# Altium footprint library Inductors THD.PcbLib: 43 footprints (part 2 of 4) (continued)
## IND_EDA-03282-V1-0_misc1 [mm] "see EDA-03282-V1-0 _misc1"
height 12.9
pads (10):
  round 2 hole 1.3: 1(-10,11.25) 1(-5,11.25) 1(0,11.25) 1(5,11.25) 1(10,11.25) 2(-10,-11.25) 2(-5,-11.25) 2(0,-11.25) 2(5,-11.25) 2(10,-11.25)
Top Overlay:
  lines w0.2: -12.3,12.6 cw(c-11.5,12) -11.5,13 -11.482,13 -10.313,12.61 ccw(c-10.25,12.8) -10.169,12.617 -9.269,13.017 ccw(c-9.309,13.109) -9.35,13.2 -10.179,12.832 cw(c-10.26,13.014) -10.324,12.825 -12.421,13.524 ccw(c-12.485,13.334) -12.683,13.361 -13.588,6.758 ccw(c-13.389,6.731) -13.589,6.731 -13.589,-6.531 ccw(c-13.389,-6.531) -13.588,-6.558 -12.683,-13.161 ccw(c-12.485,-13.134) -12.421,-13.324 -10.303,-12.618 cw(c-10.239,-12.807) -10.196,-12.612 -9.35,-12.8 -10.85,-12.8 ; -11.1,-12.4 -12.5,-12.4 -12.5,12.6 12.5,12.6 12.5,-12.4 11.1,-12.4 ; -10.85,13 -9.8,13 ; -9.55,-9.95 -9.55,9.95 ; -9.55,-9.2 9.55,-9.2 ; -9.55,9.4 9.55,9.4 ; -9.308,13 9.308,13 ; -9.307,-12.8 9.307,-12.8 ; -6.55,-8.1 -6.55,8.3 ; 6.55,-8.1 6.55,8.3 ; 9.55,-9.95 9.55,9.95 ; 9.8,13 10.85,13 ; 10.85,-12.8 9.35,-12.8 10.196,-12.612 cw(c10.239,-12.807) 10.303,-12.618 12.421,-13.324 ccw(c12.485,-13.134) 12.683,-13.161 13.588,-6.558 ccw(c13.39,-6.531) 13.59,-6.531 13.59,6.731 ccw(c13.39,6.731) 13.588,6.758 12.683,13.361 ccw(c12.485,13.334) 12.421,13.524 10.324,12.825 cw(c10.26,13.014) 10.179,12.832 9.35,13.2 ccw(c9.309,13.109) 9.269,13.017 10.169,12.617 ccw(c10.25,12.8) 10.313,12.61 11.498,13.005 ; 11.483,13 11.5,13 cw(c11.5,12) 12.3,12.6 ; -9,-8.9 -9,-8.1 9,-8.1 9,-8.9 -9,-8.9 ; -9,8.3 -9,9.1 9,9.1 9,8.3 -9,8.3
  text "10" at -11.6,-9.6 h1
  text "6" at 10.4,-9.6 h1
  text "5" at 10.4,8.6 h1
  text "1" at -10.8,8.6 h1
Mechanical 8:
  lines w0.1: -10.5,-11.25 -10,-11.25 ; -10.5,11.25 -10,11.25 ; -10,-11.75 -10,-11.25 ; -10,-10.75 -10,-11.25 ; -10,10.75 -10,11.25 ; -10,11.75 -10,11.25 ; -9.5,-11.25 -10,-11.25 ; -9.5,11.25 -10,11.25 ; -5.5,-11.25 -5,-11.25 ; -5.5,11.25 -5,11.25 ; -5,-11.75 -5,-11.25 ; -5,-10.75 -5,-11.25 ; -5,10.75 -5,11.25 ; -5,11.75 -5,11.25 ; -4.5,-11.25 -5,-11.25 ; -4.5,11.25 -5,11.25 ; -0.5,-11.25 0,-11.25 ; -0.5,0 0,0 ; -0.5,11.25 0,11.25 ; 0,-11.75 0,-11.25 ; 0,-10.75 0,-11.25 ; 0,-0.5 0,0 ; 0,0.5 0,0 ; 0,10.75 0,11.25 ; 0,11.75 0,11.25 ; 0.5,-11.25 0,-11.25 ; 0.5,0 0,0 ; 0.5,11.25 0,11.25 ; 4.5,-11.25 5,-11.25 ; 4.5,11.25 5,11.25 ; 5,-11.75 5,-11.25 ; 5,-10.75 5,-11.25 ; 5,10.75 5,11.25 ; 5,11.75 5,11.25 ; 5.5,-11.25 5,-11.25 ; 5.5,11.25 5,11.25 ; 9.5,-11.25 10,-11.25 ; 9.5,11.25 10,11.25 ; 10,-11.75 10,-11.25 ; 10,-10.75 10,-11.25 ; 10,10.75 10,11.25 ; 10,11.75 10,11.25 ; 10.5,-11.25 10,-11.25 ; 10.5,11.25 10,11.25 ; -11,-12.25 -11,-10.25 11,-10.25 11,-12.25 -11,-12.25 ; -11,10.25 -11,12.25 11,12.25 11,10.25 -11,10.25
Mechanical 14:
  lines w0.1: -12.3,-12.4 ccw(c-11.5,-11.8) -11.5,-12.8 -11.482,-12.8 ; -12.3,12.6 cw(c-11.5,12) -11.5,13 -11.482,13 ; -10.85,-12.8 -9.35,-12.8 ; -10.85,13 -9.8,13 ; -9.55,-9.2 9.55,-9.2 ; -9.55,9.4 9.55,9.4 ; -9.308,13 9.308,13 ; -9.307,-12.8 9.307,-12.8 ; -6.55,-8.1 -6.55,8.3 ; 6.55,-8.1 6.55,8.3 ; 9.8,13 10.85,13 ; 10.85,-12.8 9.35,-12.8 ; 11.483,-12.8 11.5,-12.8 ccw(c11.5,-11.8) 12.3,-12.4 ; 11.483,13 11.5,13 cw(c11.5,12) 12.3,12.6 ; -9.35,-12.8 ccw(c-9.328,-12.702) -9.307,-12.605 -10.207,-12.405 ccw(c-10.25,-12.6) -10.313,-12.41 -12.256,-13.058 cw(c-12.319,-12.868) -12.517,-12.895 -13.386,-6.558 cw(c-13.188,-6.53) -13.388,-6.531 -13.406,6.597 cw(c-13.206,6.598) -13.404,6.625 -12.517,13.095 cw(c-12.319,13.068) -12.256,13.258 -10.313,12.61 ccw(c-10.25,12.8) -10.169,12.617 -9.269,13.017 ccw(c-9.309,13.109) -9.35,13.2 -10.179,12.832 cw(c-10.26,13.014) -10.324,12.825 -12.421,13.524 ccw(c-12.485,13.334) -12.683,13.361 -13.588,6.758 ccw(c-13.389,6.731) -13.589,6.731 -13.589,-6.531 ccw(c-13.389,-6.531) -13.588,-6.558 -12.683,-13.161 ccw(c-12.485,-13.134) -12.421,-13.324 -10.303,-12.618 cw(c-10.239,-12.807) -10.196,-12.612 -9.35,-12.8 ; 9.35,-12.8 cw(c9.328,-12.702) 9.307,-12.605 10.207,-12.405 cw(c10.25,-12.6) 10.313,-12.41 12.256,-13.058 ccw(c12.319,-12.868) 12.517,-12.895 13.386,-6.558 ccw(c13.188,-6.53) 13.388,-6.531 13.406,6.598 ccw(c13.206,6.598) 13.404,6.625 12.517,13.095 ccw(c12.319,13.068) 12.256,13.258 10.313,12.61 cw(c10.25,12.8) 10.169,12.617 9.269,13.017 cw(c9.309,13.109) 9.35,13.2 10.179,12.832 ccw(c10.26,13.014) 10.324,12.825 12.421,13.524 cw(c12.485,13.334) 12.683,13.361 13.588,6.758 cw(c13.39,6.731) 13.59,6.731 13.59,-6.531 cw(c13.39,-6.531) 13.588,-6.558 12.683,-13.161 cw(c12.485,-13.134) 12.421,-13.324 10.303,-12.618 ccw(c10.239,-12.807) 10.196,-12.612 9.35,-12.8 ; -12.5,-12.4 -12.5,12.6 12.5,12.6 12.5,-12.4 -12.5,-12.4 ; -9.55,-12.2 -9.55,12.4 9.55,12.4 9.55,-12.2 -9.55,-12.2 ; -9,-8.9 -9,-8.1 9,-8.1 9,-8.9 -9,-8.9 ; -9,8.3 -9,9.1 9,9.1 9,8.3 -9,8.3
Multi-Layer:
  lines w2: -10,-11.25 10,-11.25 ; -10,11.25 10,11.25
3D body "IND_EDA-03282-V1-0_misc1.stp": height 12.9, standoff -3.5, extent -13.589,-13.333 13.59,13.534

## IND_EDA-03282-V1-0_misc2 [mm] "see EDA-03282-V1-0 _misc2"
height 12.9
pads (10):
  round 2 hole 1.3: 1(-10,11.25) 1(-5,11.25) 1(0,11.25) 1(5,11.25) 1(10,11.25) 2(-10,-11.25) 2(-5,-11.25) 2(0,-11.25) 2(5,-11.25) 2(10,-11.25)
Top Overlay:
  lines w0.2: -12.3,12.6 cw(c-11.5,12) -11.5,13 -11.482,13 -10.313,12.61 ccw(c-10.25,12.8) -10.169,12.617 -9.269,13.017 ccw(c-9.309,13.109) -9.35,13.2 -10.179,12.832 cw(c-10.26,13.014) -10.324,12.825 -12.421,13.524 ccw(c-12.485,13.334) -12.683,13.361 -13.588,6.758 ccw(c-13.389,6.731) -13.589,6.731 -13.589,-6.531 ccw(c-13.389,-6.531) -13.588,-6.558 -12.683,-13.161 ccw(c-12.485,-13.134) -12.421,-13.324 -10.303,-12.618 cw(c-10.239,-12.807) -10.196,-12.612 -9.35,-12.8 -10.85,-12.8 ; -11.1,-12.4 -12.5,-12.4 -12.5,12.6 12.5,12.6 12.5,-12.4 11.1,-12.4 ; -10.85,13 -9.8,13 ; -9.55,-9.95 -9.55,9.95 ; -9.55,-9.2 9.55,-9.2 ; -9.55,9.4 9.55,9.4 ; -9.308,13 9.308,13 ; -9.307,-12.8 9.307,-12.8 ; -6.55,-8.1 -6.55,8.3 ; 6.55,-8.1 6.55,8.3 ; 9.55,-9.95 9.55,9.95 ; 9.8,13 10.85,13 ; 10.85,-12.8 9.35,-12.8 10.196,-12.612 cw(c10.239,-12.807) 10.303,-12.618 12.421,-13.324 ccw(c12.485,-13.134) 12.683,-13.161 13.588,-6.558 ccw(c13.39,-6.531) 13.59,-6.531 13.59,6.731 ccw(c13.39,6.731) 13.588,6.758 12.683,13.361 ccw(c12.485,13.334) 12.421,13.524 10.324,12.825 cw(c10.26,13.014) 10.179,12.832 9.35,13.2 ccw(c9.309,13.109) 9.269,13.017 10.169,12.617 ccw(c10.25,12.8) 10.313,12.61 11.498,13.005 ; 11.483,13 11.5,13 cw(c11.5,12) 12.3,12.6 ; -9,-8.9 9,-8.9 9,-8.1 -9,-8.1 -9,-8.9 ; -9,8.3 9,8.3 9,9.1 -9,9.1 -9,8.3
  text "1" at -10.8,8.6 h1
  text "5" at 10.4,8.6 h1
  text "6" at 10.4,-9.6 h1
  text "10" at -11.6,-9.6 h1
Mechanical 8:
  lines w0.1: -10.5,-11.25 -10,-11.25 ; -10.5,11.25 -10,11.25 ; -10,-11.75 -10,-11.25 ; -10,-10.75 -10,-11.25 ; -10,10.75 -10,11.25 ; -10,11.75 -10,11.25 ; -9.5,-11.25 -10,-11.25 ; -9.5,11.25 -10,11.25 ; -5.5,-11.25 -5,-11.25 ; -5.5,11.25 -5,11.25 ; -5,-11.75 -5,-11.25 ; -5,-10.75 -5,-11.25 ; -5,10.75 -5,11.25 ; -5,11.75 -5,11.25 ; -4.5,-11.25 -5,-11.25 ; -4.5,11.25 -5,11.25 ; -0.5,-11.25 0,-11.25 ; -0.5,0 0,0 ; -0.5,11.25 0,11.25 ; 0,-11.75 0,-11.25 ; 0,-10.75 0,-11.25 ; 0,-0.5 0,0 ; 0,0.5 0,0 ; 0,10.75 0,11.25 ; 0,11.75 0,11.25 ; 0.5,-11.25 0,-11.25 ; 0.5,0 0,0 ; 0.5,11.25 0,11.25 ; 4.5,-11.25 5,-11.25 ; 4.5,11.25 5,11.25 ; 5,-11.75 5,-11.25 ; 5,-10.75 5,-11.25 ; 5,10.75 5,11.25 ; 5,11.75 5,11.25 ; 5.5,-11.25 5,-11.25 ; 5.5,11.25 5,11.25 ; 9.5,-11.25 10,-11.25 ; 9.5,11.25 10,11.25 ; 10,-11.75 10,-11.25 ; 10,-10.75 10,-11.25 ; 10,10.75 10,11.25 ; 10,11.75 10,11.25 ; 10.5,-11.25 10,-11.25 ; 10.5,11.25 10,11.25 ; -11,-12.25 11,-12.25 11,-10.25 -11,-10.25 -11,-12.25 ; -11,10.25 11,10.25 11,12.25 -11,12.25 -11,10.25
Mechanical 14:
  lines w0.1: -12.3,-12.4 ccw(c-11.5,-11.8) -11.5,-12.8 -11.482,-12.8 ; -12.3,12.6 cw(c-11.5,12) -11.5,13 -11.482,13 ; -10.85,-12.8 -9.35,-12.8 ; -10.85,13 -9.8,13 ; -9.55,-9.2 9.55,-9.2 ; -9.55,9.4 9.55,9.4 ; -9.308,13 9.308,13 ; -9.307,-12.8 9.307,-12.8 ; -6.55,-8.1 -6.55,8.3 ; 6.55,-8.1 6.55,8.3 ; 9.8,13 10.85,13 ; 10.85,-12.8 9.35,-12.8 ; 11.483,-12.8 11.5,-12.8 ccw(c11.5,-11.8) 12.3,-12.4 ; 11.483,13 11.5,13 cw(c11.5,12) 12.3,12.6 ; -9.35,-12.8 ccw(c-9.328,-12.702) -9.307,-12.605 -10.207,-12.405 ccw(c-10.25,-12.6) -10.313,-12.41 -12.256,-13.058 cw(c-12.319,-12.868) -12.517,-12.895 -13.386,-6.558 cw(c-13.188,-6.53) -13.388,-6.531 -13.406,6.597 cw(c-13.206,6.598) -13.404,6.625 -12.517,13.095 cw(c-12.319,13.068) -12.256,13.258 -10.313,12.61 ccw(c-10.25,12.8) -10.169,12.617 -9.269,13.017 ccw(c-9.309,13.109) -9.35,13.2 -10.179,12.832 cw(c-10.26,13.014) -10.324,12.825 -12.421,13.524 ccw(c-12.485,13.334) -12.683,13.361 -13.588,6.758 ccw(c-13.389,6.731) -13.589,6.731 -13.589,-6.531 ccw(c-13.389,-6.531) -13.588,-6.558 -12.683,-13.161 ccw(c-12.485,-13.134) -12.421,-13.324 -10.303,-12.618 cw(c-10.239,-12.807) -10.196,-12.612 -9.35,-12.8 ; 9.35,-12.8 cw(c9.328,-12.702) 9.307,-12.605 10.207,-12.405 cw(c10.25,-12.6) 10.313,-12.41 12.256,-13.058 ccw(c12.319,-12.868) 12.517,-12.895 13.386,-6.558 ccw(c13.188,-6.53) 13.388,-6.531 13.406,6.598 ccw(c13.206,6.598) 13.404,6.625 12.517,13.095 ccw(c12.319,13.068) 12.256,13.258 10.313,12.61 cw(c10.25,12.8) 10.169,12.617 9.269,13.017 cw(c9.309,13.109) 9.35,13.2 10.179,12.832 ccw(c10.26,13.014) 10.324,12.825 12.421,13.524 cw(c12.485,13.334) 12.683,13.361 13.588,6.758 cw(c13.39,6.731) 13.59,6.731 13.59,-6.531 cw(c13.39,-6.531) 13.588,-6.558 12.683,-13.161 cw(c12.485,-13.134) 12.421,-13.324 10.303,-12.618 ccw(c10.239,-12.807) 10.196,-12.612 9.35,-12.8 ; -12.5,-12.4 12.5,-12.4 12.5,12.6 -12.5,12.6 -12.5,-12.4 ; -9.55,-12.2 9.55,-12.2 9.55,12.4 -9.55,12.4 -9.55,-12.2 ; -9,-8.9 9,-8.9 9,-8.1 -9,-8.1 -9,-8.9 ; -9,8.3 9,8.3 9,9.1 -9,9.1 -9,8.3
Multi-Layer:
  lines w2: -10,-11.25 10,-11.25 ; -10,11.25 10,11.25
3D body "IND_EDA-03282-V1-0_misc2.stp": height 12.9, standoff -3.5, extent -13.589,-13.333 13.59,13.534

## IND_FERROXCUBE_WBC2.5/A-3S4 [mm] "Wideband Choke, Axial, Pad spacing 15.24 mm - Body Lengh 10mm X Body Diameter 6mm"
height 6
pads (2):
  round 1.6 hole 0.9: 1(-7.62,-1.27) 2(7.62,1.27)
Top Overlay:
  lines w0.2: -6.35,-1.27 -5.08,-1.27 ; -5.08,0 cw(c-5.08,1) -5.08,2 ; 5.08,-2 ccw(c5.08,-1) 5.08,0 ; 5.08,1.27 6.35,1.27 ; -5.08,-3 -5.08,3 5.08,3 5.08,-3 -5.08,-3
Mechanical 14:
  lines w0.1: -6.35,-1.27 -5.08,-1.27 ; -5.08,0 cw(c-5.08,1) -5.08,2 ; 5.08,-2 ccw(c5.08,-1) 5.08,0 ; 5.08,1.27 6.35,1.27 ; -5.08,-3 -5.08,3 5.08,3 5.08,-3 -5.08,-3
3D body "IND_FERROXCUBE_WBC2.5-SP-3S4.stp": height 6, standoff -3.6, extent -7.92,-2.947 7.92,3.052

## IND_FERROXCUBE_WBC2.5/A-4B1 [mm] "Wideband Choke, Axial, Pad spacing 15.24 mm - Body Lengh 10mm X Body Diameter 6mm"
height 6
pads (2):
  round 1.6 hole 0.9: 1(-7.62,-1.27) 2(7.62,1.27)
Top Overlay:
  lines w0.2: -6.35,-1.27 -5.08,-1.27 ; -5.08,0 cw(c-5.08,1) -5.08,2 ; 5.08,-2 ccw(c5.08,-1) 5.08,0 ; 5.08,1.27 6.35,1.27 ; -5.08,-3 5.08,-3 5.08,3 -5.08,3 -5.08,-3
Mechanical 14:
  lines w0.1: -6.35,-1.27 -5.08,-1.27 ; -5.08,0 cw(c-5.08,1) -5.08,2 ; 5.08,-2 ccw(c5.08,-1) 5.08,0 ; 5.08,1.27 6.35,1.27 ; -5.08,-3 5.08,-3 5.08,3 -5.08,3 -5.08,-3
3D body "IND_FERROXCUBE_WBC2.5-SP-4B1.stp": height 6, standoff -3.6, extent -7.92,-2.947 7.92,3.053

## IND_FERROXCUBE_WBC2.5/SP-3S4 [mm] "Wideband Choke, Axial, Pad spacing 15.24 mm - Body Lengh 10mm X Body Diameter 6mm"
height 6
pads (2):
  round 1.6 hole 0.9: 1(-7.62,-1.27) 2(7.62,1.27)
Top Overlay:
  lines w0.2: -6.35,-1.27 -5.08,-1.27 ; -5.08,0 cw(c-5.08,1) -5.08,2 ; 5.08,-2 ccw(c5.08,-1) 5.08,0 ; 5.08,1.27 6.35,1.27 ; -5.08,-3 5.08,-3 5.08,3 -5.08,3 -5.08,-3
Mechanical 14:
  lines w0.1: -6.35,-1.27 -5.08,-1.27 ; -5.08,0 cw(c-5.08,1) -5.08,2 ; 5.08,-2 ccw(c5.08,-1) 5.08,0 ; 5.08,1.27 6.35,1.27 ; -5.08,-3 5.08,-3 5.08,3 -5.08,3 -5.08,-3
3D body "IND_FERROXCUBE_WBC2.5-SP-3S4.stp": height 6, standoff -3.6, extent -7.92,-2.947 7.92,3.052

## IND_FERROXCUBE_WBC2.5/SP-4B1 [mm] "Wideband Choke, Axial, Pad spacing 15.24 mm - Body Lengh 10mm X Body Diameter 6mm"
height 6
pads (2):
  round 1.6 hole 0.9: 1(-7.62,-1.27) 2(7.62,1.27)
Top Overlay:
  lines w0.2: -6.35,-1.27 -5.08,-1.27 ; -5.08,0 cw(c-5.08,1) -5.08,2 ; 5.08,-2 ccw(c5.08,-1) 5.08,0 ; 5.08,1.27 6.35,1.27 ; -5.08,-3 -5.08,3 5.08,3 5.08,-3 -5.08,-3
Mechanical 14:
  lines w0.1: -6.35,-1.27 -5.08,-1.27 ; -5.08,0 cw(c-5.08,1) -5.08,2 ; 5.08,-2 ccw(c5.08,-1) 5.08,0 ; 5.08,1.27 6.35,1.27 ; -5.08,-3 -5.08,3 5.08,3 5.08,-3 -5.08,-3
3D body "IND_FERROXCUBE_WBC2.5-SP-4B1.stp": height 6, standoff -3.6, extent -7.92,-2.947 7.92,3.053

## IND_MULTICOMP_MCAP115018077A-561LU [mm] "Vertical Leaded Toroidal Inductor Lead Spacing 13.5mm D43mm x W16mm"
height 43
pads (2):
  round 2 hole 1.3: 1(-6.75,0) 2(6.7,0)
Top Overlay:
  lines w0.2: -7,-20.5 -7,-20.3 ; -7,-19.3 -7,-18.5 ; -7,-17.5 -7,-15.9 ; -7,-14.9 -7,-12.7 ; -7,-11.7 -7,-9.2 ; -7,-8.2 -7,-1.428 ; -7,1.428 -7,4.2 ; -7,5.2 -7,8.2 ; -7,9.2 -7,11.7 ; -7,12.7 -7,14.9 ; -7,15.9 -7,17.5 ; -7,18.5 -7,19.3 ; -7,20.3 -7,20.5 ; -5.389,-0.5 5.389,-0.5 ; -5.389,0.5 5.389,0.5 ; 7,-20.5 7,-20.3 ; 7,-19.3 7,-18.5 ; 7,-17.5 7,-15.9 ; 7,-14.9 7,-12.7 ; 7,-11.7 7,-9.2 ; 7,-8.2 7,-1.428 ; 7,1.428 7,4.2 ; 7,5.2 7,8.2 ; 7,9.2 7,11.7 ; 7,12.7 7,14.9 ; 7,15.9 7,17.5 ; 7,18.5 7,19.3 ; 7,20.3 7,20.5 ; -7.504,-21.5 cw(c-7.504,-21) -7.504,-20.5 7.5,-20.5 cw(c7.5,-21) 7.5,-21.5 -7.504,-21.5 ; -7.504,-20.3 cw(c-7.504,-19.8) -7.504,-19.3 7.5,-19.3 cw(c7.5,-19.8) 7.5,-20.3 -7.504,-20.3 ; -7.504,-18.5 cw(c-7.504,-18) -7.504,-17.5 7.5,-17.5 cw(c7.5,-18) 7.5,-18.5 -7.504,-18.5 ; -7.504,-15.9 cw(c-7.504,-15.4) -7.504,-14.9 7.5,-14.9 cw(c7.5,-15.4) 7.5,-15.9 -7.504,-15.9 ; -7.504,-12.7 cw(c-7.504,-12.2) -7.504,-11.7 7.5,-11.7 cw(c7.5,-12.2) 7.5,-12.7 -7.504,-12.7 ; -7.504,-9.2 cw(c-7.504,-8.7) -7.504,-8.2 7.5,-8.2 cw(c7.5,-8.7) 7.5,-9.2 -7.504,-9.2 ; -7.504,-5.2 cw(c-7.504,-4.7) -7.504,-4.2 7.5,-4.2 cw(c7.5,-4.7) 7.5,-5.2 -7.504,-5.2 ; -7.504,4.2 cw(c-7.504,4.7) -7.504,5.2 7.5,5.2 cw(c7.5,4.7) 7.5,4.2 -7.504,4.2 ; -7.504,8.2 cw(c-7.504,8.7) -7.504,9.2 7.5,9.2 cw(c7.5,8.7) 7.5,8.2 -7.504,8.2 ; -7.504,11.7 cw(c-7.504,12.2) -7.504,12.7 7.5,12.7 cw(c7.5,12.2) 7.5,11.7 -7.504,11.7 ; -7.504,14.9 cw(c-7.504,15.4) -7.504,15.9 7.5,15.9 cw(c7.5,15.4) 7.5,14.9 -7.504,14.9 ; -7.504,17.5 cw(c-7.504,18) -7.504,18.5 7.5,18.5 cw(c7.5,18) 7.5,17.5 -7.504,17.5 ; -7.504,19.3 cw(c-7.504,19.8) -7.504,20.3 7.5,20.3 cw(c7.5,19.8) 7.5,19.3 -7.504,19.3 ; -7.504,20.5 cw(c-7.504,21) -7.504,21.5 7.5,21.5 cw(c7.5,21) 7.5,20.5 -7.504,20.5
Mechanical 8:
  lines w0.1: -7.25,0 -6.75,0 ; -6.75,-0.5 -6.75,0 ; -6.75,0.5 -6.75,0 ; -6.25,0 -6.75,0 ; -0.5,0 0,0 ; 0,-0.5 0,0 ; 0,0.5 0,0 ; 0.5,0 0,0 ; 6.25,0 6.75,0 ; 6.75,-0.5 6.75,0 ; 6.75,0.5 6.75,0 ; 7.25,0 6.75,0
Mechanical 14:
  lines w0.1: -7,-20.5 -7,-20.3 ; -7,-19.3 -7,-18.5 ; -7,-17.5 -7,-15.9 ; -7,-14.9 -7,-12.7 ; -7,-11.7 -7,-9.2 ; -7,-8.2 -7,-0.5 ; -7,0.5 -7,4.2 ; -7,5.2 -7,8.2 ; -7,9.2 -7,11.7 ; -7,12.7 -7,14.9 ; -7,15.9 -7,17.5 ; -7,18.5 -7,19.3 ; -7,20.3 -7,20.5 ; 7,-20.5 7,-20.3 ; 7,-19.3 7,-18.5 ; 7,-17.5 7,-15.9 ; 7,-14.9 7,-12.7 ; 7,-11.7 7,-9.2 ; 7,-8.2 7,-0.5 ; 7,0.5 7,4.2 ; 7,5.2 7,8.2 ; 7,9.2 7,11.7 ; 7,12.7 7,14.9 ; 7,15.9 7,17.5 ; 7,18.5 7,19.3 ; 7,20.3 7,20.5 ; -7.504,-21.5 cw(c-7.504,-21) -7.504,-20.5 7.5,-20.5 cw(c7.5,-21) 7.5,-21.5 -7.504,-21.5 ; -7.504,-20.3 cw(c-7.504,-19.8) -7.504,-19.3 7.5,-19.3 cw(c7.5,-19.8) 7.5,-20.3 -7.504,-20.3 ; -7.504,-18.5 cw(c-7.504,-18) -7.504,-17.5 7.5,-17.5 cw(c7.5,-18) 7.5,-18.5 -7.504,-18.5 ; -7.504,-15.9 cw(c-7.504,-15.4) -7.504,-14.9 7.5,-14.9 cw(c7.5,-15.4) 7.5,-15.9 -7.504,-15.9 ; -7.504,-12.7 cw(c-7.504,-12.2) -7.504,-11.7 7.5,-11.7 cw(c7.5,-12.2) 7.5,-12.7 -7.504,-12.7 ; -7.504,-9.2 cw(c-7.504,-8.7) -7.504,-8.2 7.5,-8.2 cw(c7.5,-8.7) 7.5,-9.2 -7.504,-9.2 ; -7.504,-5.2 cw(c-7.504,-4.7) -7.504,-4.2 7.5,-4.2 cw(c7.5,-4.7) 7.5,-5.2 -7.504,-5.2 ; -7.504,-0.5 cw(c-7.504,0) -7.504,0.5 7.5,0.5 cw(c7.5,0) 7.5,-0.5 -7.504,-0.5 ; -7.504,4.2 cw(c-7.504,4.7) -7.504,5.2 7.5,5.2 cw(c7.5,4.7) 7.5,4.2 -7.504,4.2 ; -7.504,8.2 cw(c-7.504,8.7) -7.504,9.2 7.5,9.2 cw(c7.5,8.7) 7.5,8.2 -7.504,8.2 ; -7.504,11.7 cw(c-7.504,12.2) -7.504,12.7 7.5,12.7 cw(c7.5,12.2) 7.5,11.7 -7.504,11.7 ; -7.504,14.9 cw(c-7.504,15.4) -7.504,15.9 7.5,15.9 cw(c7.5,15.4) 7.5,14.9 -7.504,14.9 ; -7.504,17.5 cw(c-7.504,18) -7.504,18.5 7.5,18.5 cw(c7.5,18) 7.5,17.5 -7.504,17.5 ; -7.504,19.3 cw(c-7.504,19.8) -7.504,20.3 7.5,20.3 cw(c7.5,19.8) 7.5,19.3 -7.504,19.3 ; -7.504,20.5 cw(c-7.504,21) -7.504,21.5 7.5,21.5 cw(c7.5,21) 7.5,20.5 -7.504,20.5
3D body "IND_MULTICOMP_MCAP115018077A-561LU.stp": height 43, standoff -3.8, extent -8,-21.5 8,21.5

## IND_MURATA-PS_2200R [mm] "Radial Leaded Wire Wound Inductor D=7.7mm"
height 10.5
pads (2):
  round 1.6 hole 0.9: 1(-1.5,0) 2(1.5,0)
Top Overlay:
  lines w0.2: -3.591,-0.25 cw(c-3.6,0) -3.591,0.25 cw(c0,0) 3.591,0.25 cw(c3.6,0) 3.591,-0.25 cw(c0,0) -3.591,-0.25
Mechanical 8:
  lines w0.1: -2.5,0 -1.5,0 ; -1.5,-1 -1.5,0 ; -1.5,1 -1.5,0 ; -1,0 0,0 ; -0.5,0 -1.5,0 ; 0,-1 0,0 ; 0,1 0,0 ; 0.5,0 1.5,0 ; 1,0 0,0 ; 1.5,-1 1.5,0 ; 1.5,1 1.5,0 ; 2.5,0 1.5,0
Mechanical 14:
  lines w0.1: -3.591,-0.25 ccw(c0,0) 3.591,-0.25 ccw(c3.6,0) 3.591,0.25 ccw(c0,0) -3.591,0.25 ccw(c-3.6,0) -3.591,-0.25
3D body "INDRD_MURATA-PS_2200R.stp": height 10.5, standoff -3.3, extent -3.85,-3.6 3.85,3.6

## IND_NKL_R1003VKS [mm] "Current Compensated Chokes R1003VKS Series"
height 13
pads (4):
  round 1.4 hole 0.7: 1(-3.75,-2) 2(-3.75,2) 3(3.75,-2) 4(3.75,2)
Top Overlay:
  lines w0.2: -5.05,-2.338 -5.05,-3.05 5.05,-3.05 5.05,-2.338 ; -5.05,2.338 -5.05,3.05 5.05,3.05 5.05,2.338 ; -4.799,-2.05 cw(c-3.85,-0.7) -5.5,-0.7 -5.5,0.7 cw(c-3.85,0.7) -4.799,2.05 ; -4.765,-2.267 cw(c-4.25,-0.7) -5.9,-0.7 -5.9,0.7 cw(c-4.25,0.7) -4.765,2.267 ; -4.744,-2.339 cw(c-4.55,-0.7) -6.2,-0.7 -6.2,0.7 cw(c-4.55,0.7) -4.744,2.339 ; -4.74,-2.35 -4.85,-2.35 cw(c-4.85,-0.7) -6.5,-0.7 -6.5,0.7 cw(c-4.85,0.7) -4.85,2.35 -4.74,2.35 ; -4.725,-1.611 cw(c-3.35,-0.7) -5,-0.7 -5,0.7 cw(c-3.35,0.7) -4.725,1.611 ; -4.485,-1.25 cw(c-3.2,-1.05) -4.5,-1.05 -4.5,1.05 cw(c-3.2,1.05) -4.485,1.25 ; -3.7,-0.951 -3.7,0.951 ; -2.76,-2.35 -1.49,-2.35 ; -2.759,-2.348 ccw(c-2.7,-1.35) -2.7,-2.35 ; -2.759,2.348 cw(c-2.7,1.35) -2.7,2.35 ; -2.76,2.35 -1.49,2.35 ; -1.9,-2.35 cw(c-1.9,-1.55) -2.7,-1.55 -2.7,1.55 cw(c-1.9,1.55) -1.9,2.35 ; -1.7,-2.35 cw(c-1.7,-2.05) -2,-2.05 -2,2.05 cw(c-1.7,2.05) -1.7,2.35 ; -1.49,-3.05 -1.49,3.05 ; 1.49,-3.05 1.49,3.05 ; 1.49,-2.35 2.76,-2.35 ; 1.49,2.35 2.76,2.35 ; 1.7,-2.35 ccw(c1.7,-2.05) 2,-2.05 2,2.05 ccw(c1.7,2.05) 1.7,2.35 ; 1.9,-2.35 ccw(c1.9,-1.55) 2.7,-1.55 2.7,1.55 ccw(c1.9,1.55) 1.9,2.35 ; 2.7,-2.35 ccw(c2.7,-1.35) 2.759,-2.348 ; 2.7,2.35 cw(c2.7,1.35) 2.759,2.348 ; 3.7,-0.951 3.7,0.951 ; 4.485,-1.25 ccw(c3.2,-1.05) 4.5,-1.05 4.5,1.05 ccw(c3.2,1.05) 4.485,1.25 ; 4.725,-1.611 ccw(c3.35,-0.7) 5,-0.7 5,0.7 ccw(c3.35,0.7) 4.725,1.611 ; 4.74,-2.35 4.85,-2.35 ccw(c4.85,-0.7) 6.5,-0.7 6.5,0.7 ccw(c4.85,0.7) 4.85,2.35 4.74,2.35 ; 4.744,-2.339 ccw(c4.55,-0.7) 6.2,-0.7 6.2,0.7 ccw(c4.55,0.7) 4.744,2.339 ; 4.765,-2.267 ccw(c4.25,-0.7) 5.9,-0.7 5.9,0.7 ccw(c4.25,0.7) 4.765,2.267 ; 4.799,-2.05 ccw(c3.85,-0.7) 5.5,-0.7 5.5,0.7 ccw(c3.85,0.7) 4.799,2.05
  text "1" at -3.1,-4 h1.5
Mechanical 8:
  lines w0.1: -4.25,-2 -3.75,-2 ; -4.25,2 -3.75,2 ; -3.75,-2.5 -3.75,-2 ; -3.75,-1.5 -3.75,-2 ; -3.75,1.5 -3.75,2 ; -3.75,2.5 -3.75,2 ; -3.25,-2 -3.75,-2 ; -3.25,2 -3.75,2 ; -0.5,0 0,0 ; 0,-0.5 0,0 ; 0,0.5 0,0 ; 0.5,0 0,0 ; 3.25,-2 3.75,-2 ; 3.25,2 3.75,2 ; 3.75,-2.5 3.75,-2 ; 3.75,-1.5 3.75,-2 ; 3.75,1.5 3.75,2 ; 3.75,2.5 3.75,2 ; 4.25,-2 3.75,-2 ; 4.25,2 3.75,2
Mechanical 14:
  lines w0.1: -5.05,-2.338 -5.05,-3.05 5.05,-3.05 5.05,-2.338 ; -5.05,2.338 -5.05,3.05 5.05,3.05 5.05,2.338 ; -4.55,-2.35 cw(c-4.55,-0.7) -6.2,-0.7 -6.2,0.7 cw(c-4.55,0.7) -4.55,2.35 ; -4.25,-2.35 cw(c-4.25,-0.7) -5.9,-0.7 -5.9,0.7 cw(c-4.25,0.7) -4.25,2.35 ; -3.85,-2.35 cw(c-3.85,-0.7) -5.5,-0.7 -5.5,0.7 cw(c-3.85,0.7) -3.85,2.35 ; -3.35,-2.35 cw(c-3.35,-0.7) -5,-0.7 -5,0.7 cw(c-3.35,0.7) -3.35,2.35 ; -3.2,-2.35 cw(c-3.2,-1.05) -4.5,-1.05 -4.5,1.05 cw(c-3.2,1.05) -3.2,2.35 ; -2.7,-2.35 cw(c-2.7,-1.35) -3.7,-1.35 -3.7,1.35 cw(c-2.7,1.35) -2.7,2.35 ; -1.9,-2.35 cw(c-1.9,-1.55) -2.7,-1.55 -2.7,1.55 cw(c-1.9,1.55) -1.9,2.35 ; -1.7,-2.35 cw(c-1.7,-2.05) -2,-2.05 -2,2.05 cw(c-1.7,2.05) -1.7,2.35 ; -1.49,-3.05 -1.49,3.05 ; -1.49,-2.35 -4.85,-2.35 cw(c-4.85,-0.7) -6.5,-0.7 -6.5,0.7 cw(c-4.85,0.7) -4.85,2.35 -1.49,2.35 ; 1.49,-3.05 1.49,3.05 ; 1.49,-2.35 4.85,-2.35 ccw(c4.85,-0.7) 6.5,-0.7 6.5,0.7 ccw(c4.85,0.7) 4.85,2.35 1.49,2.35 ; 1.7,-2.35 ccw(c1.7,-2.05) 2,-2.05 2,2.05 ccw(c1.7,2.05) 1.7,2.35 ; 1.9,-2.35 ccw(c1.9,-1.55) 2.7,-1.55 2.7,1.55 ccw(c1.9,1.55) 1.9,2.35 ; 2.7,-2.35 ccw(c2.7,-1.35) 3.7,-1.35 3.7,1.35 ccw(c2.7,1.35) 2.7,2.35 ; 3.2,-2.35 ccw(c3.2,-1.05) 4.5,-1.05 4.5,1.05 ccw(c3.2,1.05) 3.2,2.35 ; 3.35,-2.35 ccw(c3.35,-0.7) 5,-0.7 5,0.7 ccw(c3.35,0.7) 3.35,2.35 ; 3.85,-2.35 ccw(c3.85,-0.7) 5.5,-0.7 5.5,0.7 ccw(c3.85,0.7) 3.85,2.35 ; 4.25,-2.35 ccw(c4.25,-0.7) 5.9,-0.7 5.9,0.7 ccw(c4.25,0.7) 4.25,2.35 ; 4.55,-2.35 ccw(c4.55,-0.7) 6.2,-0.7 6.2,0.7 ccw(c4.55,0.7) 4.55,2.35
  text "1" at -3.1,-4 h1.5
3D body "IND_NKL_R1003VKS.stp": height 13, standoff -3.6, extent -6.5,-3.05 6.5,3.05

## IND_NURATA_52000 [mm] "PCB Mounted Common Mode Chokes, Body L 25.5mm x W 16.3mm x H 31mm"
height 31
pads (4):
  round 1.7 hole 1: 1(-10.16,-5.08) 2(10.16,-5.08) 3(10.16,5.08) 4(-10.16,5.08)
Top Overlay:
  lines w0.2: -12.75,-5.83 cw(c-12.75,-5.08) -12.75,-4.33 ; -11.272,-4.786 cw(c-10.5,-3.5) -12,-3.5 -12,3.5 cw(c-10.5,3.5) -11.272,4.786 ; -10.848,-4.158 cw(c-9.5,-3.5) -11,-3.5 -11,3.5 cw(c-9.5,3.5) -10.848,4.158 ; -9.93,-3.953 cw(c-8.5,-3.5) -10,-3.5 -10,3.5 cw(c-8.5,3.5) -9.93,3.953 ; -9.023,-4.906 ccw(c-8.5,-3.5) -8.5,-5 ; -9.023,4.906 cw(c-8.5,3.5) -8.5,5 ; -9.013,-5 -2.266,-5 ccw(c-2.266,-4.5) -1.766,-4.501 -1.752,4.499 ; -9.013,5 -2.252,5 cw(c-2.252,4.5) -1.752,4.499 ; -7.5,-5 cw(c-7.5,-3.5) -9,-3.5 -9,3.5 cw(c-7.5,3.5) -7.5,5 ; -6.5,-5 cw(c-6.5,-3.5) -8,-3.5 -8,3.5 cw(c-6.5,3.5) -6.5,5 ; -5.5,-5 cw(c-5.5,-3.5) -7,-3.5 -7,3.5 cw(c-5.5,3.5) -5.5,5 ; -4.5,-5 cw(c-4.5,-3.5) -6,-3.5 -6,3.5 cw(c-4.5,3.5) -4.5,5 ; -3.5,-5 cw(c-3.5,-3.5) -5,-3.5 -5,3.5 cw(c-3.5,3.5) -3.5,5 ; -2.819,-4.966 cw(c-2.5,-3.5) -4,-3.5 -4,3.5 cw(c-2.5,3.5) -2.811,4.967 ; -1.991,-4.918 cw(c-1.5,-3.5) -3,-3.5 -3,3.5 cw(c-1.5,3.5) -1.982,4.92 ; -1.777,-4.606 cw(c-0.764,-3.5) -2.264,-3.5 -2.264,3.5 cw(c-0.764,3.5) -1.766,4.616 ; -1.766,-4.5 1.759,-4.5 ; -1.6,-4.5 -1.6,-6 1.6,-6 1.6,-4.5 ; -1.6,4.5 -1.6,6 1.6,6 1.6,4.5 ; 1.773,-4.617 ccw(c0.772,-3.5) 2.272,-3.5 2.272,3.5 ccw(c0.772,3.5) 1.773,4.617 ; 1.986,-4.919 ccw(c1.5,-3.5) 3,-3.5 3,3.5 ccw(c1.5,3.5) 1.986,4.919 ; 2.81,-4.968 ccw(c2.5,-3.5) 4,-3.5 4,3.5 ccw(c2.5,3.5) 2.81,4.968 ; 3.5,-5 ccw(c3.5,-3.5) 5,-3.5 5,3.5 ccw(c3.5,3.5) 3.5,5 ; 4.5,-5 ccw(c4.5,-3.5) 6,-3.5 6,3.5 ccw(c4.5,3.5) 4.5,5 ; 5.5,-5 ccw(c5.5,-3.5) 7,-3.5 7,3.5 ccw(c5.5,3.5) 5.5,5 ; 6.5,-5 ccw(c6.5,-3.5) 8,-3.5 8,3.5 ccw(c6.5,3.5) 6.5,5 ; 7.5,-5 ccw(c7.5,-3.5) 9,-3.5 9,3.5 ccw(c7.5,3.5) 7.5,5 ; 8.5,-5 ccw(c8.5,-3.5) 9.023,-4.906 ; 8.5,5 cw(c8.5,3.5) 9.023,4.906 ; 9.013,-5 2.259,-5 cw(c2.259,-4.5) 1.759,-4.5 ; 9.013,5 2.259,5 ccw(c2.259,4.5) 1.759,4.5 ; 9.93,-3.953 ccw(c8.5,-3.5) 10,-3.5 10,3.5 ccw(c8.5,3.5) 9.93,3.953 ; 10.848,-4.158 ccw(c9.5,-3.5) 11,-3.5 11,3.5 ccw(c9.5,3.5) 10.848,4.158 ; 11.272,-4.786 ccw(c10.5,-3.5) 12,-3.5 12,3.5 ccw(c10.5,3.5) 11.272,4.786 ; -1.752,4.5 1.759,4.5 ; 1.759,-4.5 1.759,4.5 ; -12.75,-8.15 12.75,-8.15 12.75,8.15 -12.75,8.15 -12.75,-8.15
Mechanical 8:
  lines w0.1: -10.66,-5.08 -10.16,-5.08 ; -10.66,5.08 -10.16,5.08 ; -10.16,-5.58 -10.16,-5.08 ; -10.16,-4.58 -10.16,-5.08 ; -10.16,4.58 -10.16,5.08 ; -10.16,5.58 -10.16,5.08 ; -9.66,-5.08 -10.16,-5.08 ; -9.66,5.08 -10.16,5.08 ; -0.5,0 0,0 ; 0,-0.5 0,0 ; 0,0.5 0,0 ; 0.5,0 0,0 ; 9.66,-5.08 10.16,-5.08 ; 9.66,5.08 10.16,5.08 ; 10.16,-5.58 10.16,-5.08 ; 10.16,-4.58 10.16,-5.08 ; 10.16,4.58 10.16,5.08 ; 10.16,5.58 10.16,5.08 ; 10.66,-5.08 10.16,-5.08 ; 10.66,5.08 10.16,5.08
Mechanical 14:
  lines w0.1: -12.75,-5.83 cw(c-12.75,-5.08) -12.75,-4.33 ; -9.5,-5 cw(c-9.5,-3.5) -11,-3.5 -11,3.5 cw(c-9.5,3.5) -9.5,5 ; -8.5,-5 cw(c-8.5,-3.5) -10,-3.5 -10,3.5 cw(c-8.5,3.5) -8.5,5 ; -7.5,-5 cw(c-7.5,-3.5) -9,-3.5 -9,3.5 cw(c-7.5,3.5) -7.5,5 ; -6.5,-5 cw(c-6.5,-3.5) -8,-3.5 -8,3.5 cw(c-6.5,3.5) -6.5,5 ; -5.5,-5 cw(c-5.5,-3.5) -7,-3.5 -7,3.5 cw(c-5.5,3.5) -5.5,5 ; -4.5,-5 cw(c-4.5,-3.5) -6,-3.5 -6,3.5 cw(c-4.5,3.5) -4.5,5 ; -3.5,-5 cw(c-3.5,-3.5) -5,-3.5 -5,3.5 cw(c-3.5,3.5) -3.5,5 ; -2.819,-4.966 cw(c-2.5,-3.5) -4,-3.5 -4,3.5 cw(c-2.5,3.5) -2.811,4.967 ; -1.991,-4.918 cw(c-1.5,-3.5) -3,-3.5 -3,3.5 cw(c-1.5,3.5) -1.982,4.92 ; -1.777,-4.606 cw(c-0.764,-3.5) -2.264,-3.5 -2.264,3.5 cw(c-0.764,3.5) -1.766,4.616 ; -1.766,-4.5 1.759,-4.5 ; -1.6,-4.5 -1.6,-6 1.6,-6 1.6,-4.5 ; -1.6,4.5 -1.6,6 1.6,6 1.6,4.5 ; 1.773,-4.617 ccw(c0.772,-3.5) 2.272,-3.5 2.272,3.5 ccw(c0.772,3.5) 1.773,4.617 ; 1.986,-4.919 ccw(c1.5,-3.5) 3,-3.5 3,3.5 ccw(c1.5,3.5) 1.986,4.919 ; 2.81,-4.968 ccw(c2.5,-3.5) 4,-3.5 4,3.5 ccw(c2.5,3.5) 2.81,4.968 ; 3.5,-5 ccw(c3.5,-3.5) 5,-3.5 5,3.5 ccw(c3.5,3.5) 3.5,5 ; 4.5,-5 ccw(c4.5,-3.5) 6,-3.5 6,3.5 ccw(c4.5,3.5) 4.5,5 ; 5.5,-5 ccw(c5.5,-3.5) 7,-3.5 7,3.5 ccw(c5.5,3.5) 5.5,5 ; 6.5,-5 ccw(c6.5,-3.5) 8,-3.5 8,3.5 ccw(c6.5,3.5) 6.5,5 ; 7.5,-5 ccw(c7.5,-3.5) 9,-3.5 9,3.5 ccw(c7.5,3.5) 7.5,5 ; 8.5,-5 ccw(c8.5,-3.5) 10,-3.5 10,3.5 ccw(c8.5,3.5) 8.5,5 ; 9.5,-5 ccw(c9.5,-3.5) 11,-3.5 11,3.5 ccw(c9.5,3.5) 9.5,5 ; -1.752,4.499 ccw(c-2.252,4.5) -2.252,5 -10.5,5 ccw(c-10.5,3.5) -12,3.5 -12,-3.5 ccw(c-10.5,-3.5) -10.5,-5 -2.266,-5 ccw(c-2.266,-4.5) -1.766,-4.501 -1.752,4.499 ; -1.752,4.5 1.759,4.5 ; 1.759,-4.5 ccw(c2.259,-4.5) 2.259,-5 10.5,-5 ccw(c10.5,-3.5) 12,-3.5 12,3.5 ccw(c10.5,3.5) 10.5,5 2.259,5 ccw(c2.259,4.5) 1.759,4.5 ; 1.759,-4.5 1.759,4.5 ; -12.75,-8.15 12.75,-8.15 12.75,8.15 -12.75,8.15 -12.75,-8.15
3D body "IND_NURATA_52000.stp": height 31, standoff -3.35, extent -13.5,-8.15 12.75,8.15

## IND_PANASONIC_09D [mm] "Radial Leaded Wire Wound Inductor D=9.5mm"
height 8.9
pads (2):
  round 1.4 hole 0.9: 1(-2.5,0) 2(2.5,0)
Top Overlay:
  circle w0.2: c0,0 r4.75
Mechanical 14:
  circle w0.1: c0,0 r4.75
3D body "IND_PANASONIC_09D.stp": height 8.9, standoff -4.1, extent -4.75,-4.75 4.75,4.75